# Altium footprint library USBes.PcbLib: 65 footprints (part 2 of 5)
Each footprint in its own frame and in the unit in brackets; x right, y up, seen from the top. Pads: shape width x height; smd on the part's side, far side on the other; paste and mask are expansions set on the pad; w line width, h text height; cw(c..) or ccw(c..) is an arc to the next point about the centre after c.
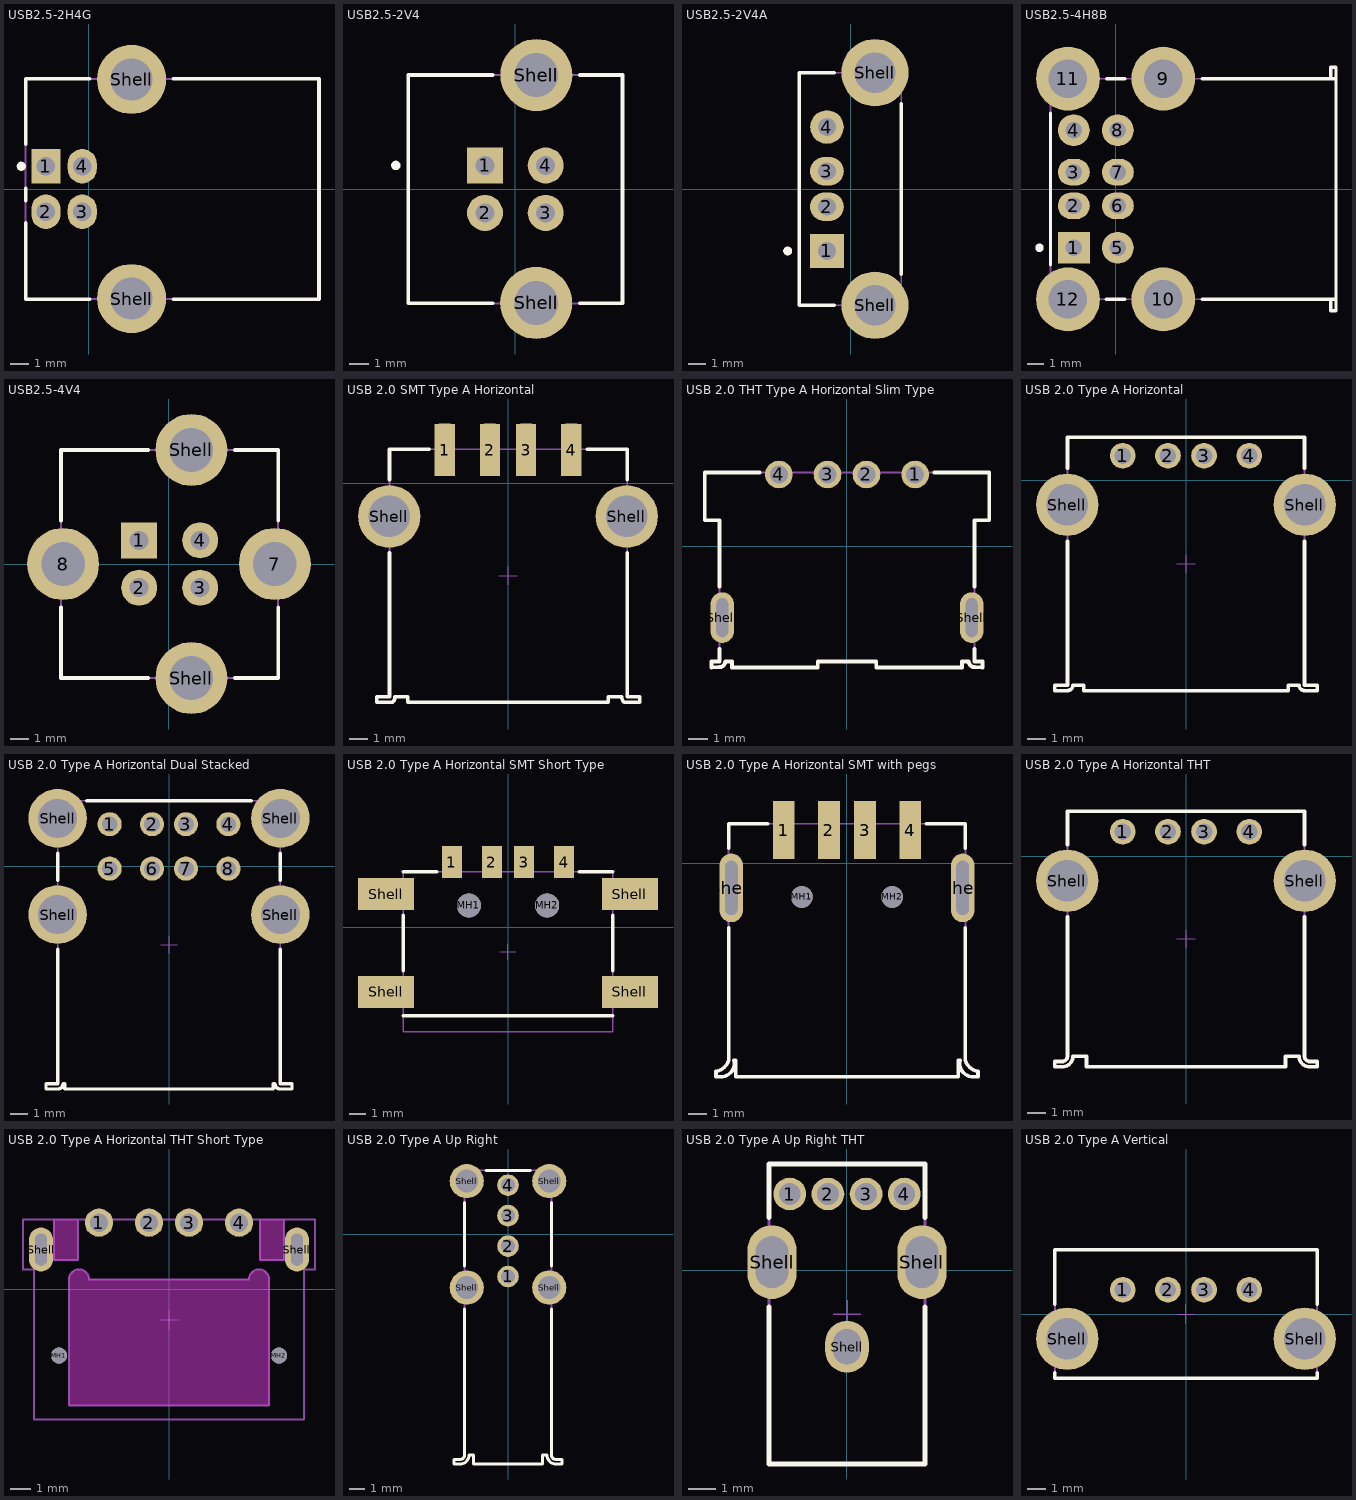
[diagram p1: the footprints below, top view; thin cyan lines are the x and y axes]

## USB2.5-2H4G [mm] "Connector; USB1.1, Type B, Thru-Hole; 4 Position; Right Angle"
height 10.95
pads (6):
  rect 1.6x1.9 hole 1: 1(-2.355,1.25)
  oval 1.6x1.9 hole 1: 2(-2.355,-1.25) 3(-0.355,-1.25) 4(-0.355,1.25)
  round 3.8 hole 2.3: Shell(2.355,-6.02) Shell(2.355,6.02)
Top Overlay:
  circle w0.25: c-3.705,1.25 r0.125
  lines w0.2: -3.465,-1.85 -3.465,-6.05 0.055,-6.05 ; -3.465,-0.65 -3.465,0.05 ; -3.465,2.45 -3.465,6.05 0.055,6.05 ; 4.655,-6.05 12.635,-6.05 ; 4.655,6.05 12.635,6.05 ; 12.655,-6.05 12.655,6.05
Mechanical 13:
  lines w0.1: -3.465,-6.05 12.635,-6.05 12.635,6.05 -3.465,6.05 -3.465,-6.05
3D body "Samtec-DEFAULT.STEP": height 11.05, standoff 0.55, extent 2.582,-5.625 68.532,5.575
3D body "14389.STEP": height 10.95, standoff -3.7, extent -3.855,-7.45 12.645,7.448

## USB2.5-2V4 [mm] "Connector; USB1.1, Type B, Thru-Hole; 4 Position; Vertical ef"
height 16
pads (6):
  rect 1.9x1.9 hole 1: 1(-1.6,1.24)
  round 1.9 hole 1: 2(-1.6,-1.26) 3(1.6,-1.26) 4(1.6,1.24)
  round 3.8 hole 2.3: Shell(1.1,-6.01) Shell(1.11,6.01)
Top Overlay:
  circle w0.25: c-6.3,1.24 r0.125
  lines w0.2: -1.19,-6.03 -5.65,-6.03 -5.65,6.01 -1.19,6.01 ; 3.41,-6.03 5.65,-6.03 5.65,6.01 3.41,6.01
Mechanical 13:
  lines w0.1: -5.65,-6.03 -5.65,6.01 5.65,6.01 5.65,-6.03 -5.65,-6.03
3D body "12039.STEP": height 15.62, standoff -4.02, extent -5.753,-7.585 5.703,7.565

## USB2.5-2V4A [mm] "Connector; USB1.1, Type A, Thru-Hole; 4 Position; Vertical"
height 15
pads (6):
  rect 1.9x1.9 hole 1: 1(-1.355,-3.5)
  oval 1.9x1.6 hole 1: 2(-1.355,-1) 3(-1.355,1)
  round 1.9 hole 1: 4(-1.355,3.5)
  round 3.8 hole 2.3: Shell(1.355,-6.57) Shell(1.355,6.57)
Top Overlay:
  circle w0.25: c-3.575,-3.5 r0.125
  lines w0.2: -0.945,-6.57 -2.925,-6.57 -2.925,6.57 -0.945,6.57 ; 2.835,-4.81 2.835,4.81
Mechanical 13:
  lines w0.1: -2.925,-6.57 -2.925,6.57 2.835,6.57 2.835,-6.57 -2.925,-6.57
3D body "14382.STEP": height 15, standoff -2.99, extent -3.865,-7.992 3.775,7.992

## USB2.5-4H8B [mm] "Connector; USB1.1, Type A, Thru-Hole; 4x4 Position; Right Angle"
height 15.82
pads (12):
  rect 1.9x1.9 hole 1: 1(-2.49,-3.5)
  oval 1.9x1.6 hole 1: 2(-2.49,-1) 3(-2.49,1) 6(0.13,-1) 7(0.13,1)
  round 1.9 hole 1: 4(-2.49,3.5) 5(0.13,-3.5) 8(0.13,3.5)
  round 3.8 hole 2.3: 9(2.84,6.57) 10(2.84,-6.57) 11(-2.84,6.57) 12(-2.84,-6.57)
Top Overlay:
  circle w0.25: c-4.53,-3.5 r0.125
  lines w0.2: -3.88,-4.51 -3.88,4.51 ; -0.56,-6.57 0.54,-6.57 ; -0.54,6.57 0.54,6.57 ; 5.15,-6.57 13.12,-6.57 ; 5.15,6.57 13.12,6.57 ; 12.8,-6.57 12.8,-7.25 13.12,-7.25 13.12,-6.57 ; 12.8,6.57 12.8,7.25 13.12,7.25 13.12,6.57 ; 13.12,-6.57 13.12,6.57
Mechanical 13:
  lines w0.1: -3.88,-7.25 -3.88,7.25 ; -3.88,-6.57 12.8,-6.57 12.8,-7.25 13.12,-7.25 13.12,7.25 12.8,7.25 12.8,6.57 -3.88,6.57
3D body "14378.STEP": height 15.6, standoff -3.8, extent -3.88,-7.849 13.718,7.851

## USB2.5-4V4 [mm] "Connector; USB1.1, Type B, Thru-Hole; 4 Position; Vertical"
height 15.62
pads (8):
  rect 1.9x1.9 hole 1: 1(-1.575,1.25)
  round 1.9 hole 1: 2(-1.575,-1.25) 3(1.645,-1.25) 4(1.645,1.25)
  round 3.8 hole 2.3: 7(5.595,0) 8(-5.595,0) Shell(1.185,-6.02) Shell(1.185,6.02)
Top Overlay:
  lines w0.2: -5.695,-2.3 -5.695,-6.02 -1.115,-6.02 ; -5.695,2.3 -5.695,6.02 -1.115,6.02 ; 3.485,-6.02 5.765,-6.02 5.765,-2.3 ; 3.485,6.02 5.765,6.02 5.765,2.3
Mechanical 13:
  lines w0.1: -5.695,-6.02 -5.695,6.02 5.765,6.02 5.765,-6.02 -5.695,-6.02
3D body "5881.STEP": height 15.8, standoff -4.74, extent -5.615,-7.55 5.885,7.55

## USB 2.0 SMT Type A Horizontal [mm] "USB 2.0 SMT Type A Horizontal"
height 7.12
pads (6):
  rect 1.12x2.88 smd: 1(-3.5,1.835) 2(-1,1.835) 3(1,1.835) 4(3.5,1.835)
  round 3.45 hole 2.3: Shell(-6.57,-1.835) Shell(6.57,-1.835)
Top Overlay:
  lines w0.2: -6.55,-3.855 -6.55,-11.815 -7.25,-11.815 -7.25,-12.115 -6.39,-12.115 ; -6.55,0.185 -6.55,1.885 -4.35,1.885 ; -6.388,-12.117 ccw(c-6.65,-11.815) -6.25,-11.815 -5.55,-11.815 -5.55,-12.115 5.55,-12.115 5.55,-11.815 6.29,-11.815 ccw(c6.69,-11.815) 6.428,-12.117 ; 4.39,1.885 6.59,1.885 6.59,0.185 ; 6.43,-12.115 7.29,-12.115 7.29,-11.815 6.59,-11.815 6.59,-3.855
Mechanical 13:
  lines w0.1: -6.39,-12.115 -7.25,-12.115 -7.25,-11.815 -6.55,-11.815 -6.55,1.885 6.59,1.885 6.59,-11.815 7.29,-11.815 7.29,-12.115 6.43,-12.115 ; -6.388,-12.117 ccw(c-6.65,-11.815) -6.25,-11.815 -5.55,-11.815 -5.55,-12.115 5.55,-12.115 5.55,-11.815 6.29,-11.815 ccw(c6.69,-11.815) 6.428,-12.117 ; -3.8,1.885 -3.8,3.285 -3.2,3.285 -3.2,1.885 ; -1.3,1.885 -1.3,3.285 -0.7,3.285 -0.7,1.885 ; 0.7,1.885 0.7,3.285 1.3,3.285 1.3,1.885 ; 3.2,1.885 3.2,3.285 3.8,3.285 3.8,1.885
Mechanical 15:
  lines w0.05: -0.5,-5.115 0.5,-5.115 ; 0,-5.615 0,-4.615
3D body "62900416021.stp": height 7.81, standoff -3.89, extent -7.808,-12.115 7.81,3.29

## USB 2.0 THT Type A Horizontal Slim Type [mm] "USB 2.0 THT Type A Horizontal Slim Type"
height 6.82
pads (6):
  round 1.42 hole 0.92: 1(3.5,3.675) 2(1,3.675) 3(-1,3.675) 4(-3.5,3.675)
  oval 1.2x2.6 hole 0.6 slot 2 at 90 deg: Shell(-6.4,-3.675) Shell(6.4,-3.675)
Top Overlay:
  lines w0.2: -6.55,-5.275 -6.55,-5.915 -6.95,-5.915 -6.95,-6.225 -6.56,-6.215 ccw(c-6.55,-5.915) -6.25,-5.915 -5.9,-5.915 -5.9,-6.225 -1.5,-6.225 -1.5,-5.925 1.5,-5.925 1.5,-6.225 5.9,-6.225 5.9,-5.915 6.25,-5.915 ccw(c6.55,-5.915) 6.56,-6.215 6.95,-6.225 6.95,-5.915 6.55,-5.915 6.55,-5.275 ; -6.55,-2.075 -6.55,1.325 -7.3,1.325 -7.3,3.775 -4.5,3.775 ; 4.5,3.775 7.3,3.775 7.3,1.325 6.55,1.325 6.55,-2.075
Mechanical 13:
  lines w0.1: -7.3,1.325 -6.55,1.325 -6.55,-5.915 -6.95,-5.915 -6.95,-6.225 -6.56,-6.215 ccw(c-6.55,-5.915) -6.25,-5.915 -5.9,-5.915 -5.9,-6.225 -1.5,-6.225 -1.5,-5.925 1.5,-5.925 1.5,-6.225 5.9,-6.225 5.9,-5.915 6.25,-5.915 ccw(c6.55,-5.915) 6.56,-6.215 6.95,-6.225 6.95,-5.915 6.55,-5.915 6.55,1.325 7.3,1.325 7.3,3.775 -7.3,3.775 -7.3,1.325
3D body "614104150121.stp": height 7.24, standoff -1.58, extent -7.3,-6.225 7.3,3.775

## USB 2.0 Type A Horizontal [mm] "USB 2.0 Type A Horizontal"
height 6.9
pads (6):
  round 1.42 hole 0.92: 1(-3.5,1.355) 2(-1,1.355) 3(1,1.355) 4(3.5,1.355)
  round 3.45 hole 2.3: Shell(-6.57,-1.355) Shell(6.57,-1.355)
Top Overlay:
  lines w0.2: -6.55,-3.375 -6.55,-11.335 -7.25,-11.335 -7.25,-11.635 -6.56,-11.635 ccw(c-6.55,-11.335) -6.25,-11.335 -5.65,-11.335 -5.65,-11.635 5.65,-11.635 5.65,-11.335 6.25,-11.335 ccw(c6.55,-11.335) 6.56,-11.635 7.25,-11.635 7.25,-11.335 6.55,-11.335 6.55,-3.375 ; -6.55,0.665 -6.55,2.365 6.55,2.365 6.55,0.665
Mechanical 2:
  lines w0.1: -5.65,-11.635 5.65,-11.635
Mechanical 13:
  lines w0.1: -7.25,-11.635 -6.56,-11.635 ccw(c-6.55,-11.335) -6.25,-11.335 -5.65,-11.335 -5.65,-11.635 5.65,-11.635 5.65,-11.335 6.25,-11.335 ccw(c6.55,-11.335) 6.56,-11.635 7.25,-11.635 7.25,-11.335 6.55,-11.335 6.55,2.365 -6.55,2.365 -6.55,-11.335 -7.25,-11.335 -7.25,-11.635
Mechanical 15:
  lines w0.05: -0.5,-4.635 0.5,-4.635 ; 0,-5.135 0,-4.135
3D body "61400416021.stp": height 7.63, standoff -4.06, extent -7.998,-11.635 7.998,2.365

## USB 2.0 Type A Horizontal Dual Stacked [mm] "USB 2.0 Type A Horizontal Dual Stacked"
height 15.34
pads (12):
  round 1.42 hole 0.92: 1(-3.5,2.49) 2(-1,2.49) 3(1,2.49) 4(3.5,2.49) 5(-3.5,-0.13) 6(-1,-0.13) 7(1,-0.13) 8(3.5,-0.13)
  round 3.45 hole 2.3: Shell(-6.57,-2.84) Shell(-6.57,2.84) Shell(6.57,-2.84) Shell(6.57,2.84)
Top Overlay:
  lines w0.2: -6.55,-4.87 -6.55,-12.82 -7.25,-12.82 -7.25,-13.12 -6.56,-13.12 ccw(c-6.55,-12.82) -6.25,-12.82 -6.15,-12.82 -6.15,-13.12 6.15,-13.12 6.15,-12.82 6.25,-12.82 ccw(c6.55,-12.82) 6.56,-13.12 7.25,-13.12 7.25,-12.82 6.55,-12.82 6.55,-4.87 ; -6.55,-0.81 -6.55,0.78 ; -4.85,3.88 4.85,3.88 ; 6.55,-0.81 6.55,0.78
Mechanical 13:
  lines w0.1: -7.25,-13.12 -7.25,-12.82 -6.55,-12.82 -6.55,3.88 6.55,3.88 6.55,-12.82 7.25,-12.82 7.25,-13.12 6.56,-13.12 cw(c6.55,-12.82) 6.25,-12.82 6.15,-12.82 6.15,-13.12 -6.15,-13.12 -6.15,-12.82 -6.25,-12.82 cw(c-6.55,-12.82) -6.56,-13.12 -7.25,-13.12
Mechanical 15:
  lines w0.05: -0.5,-4.62 0.5,-4.62 ; 0,-5.12 0,-4.12
3D body "61400826021.stp": height 15.93, standoff -3.91, extent -7.913,-13.12 7.913,4.03

## USB 2.0 Type A Horizontal SMT Short Type [mm] "USB 2.0 Type A Horizontal SMT Short Type"
height 6.3
pads (10):
  rect 1.25x2 smd: 1(-3.5,4.05) 2(-1,4.05) 3(1,4.05) 4(3.5,4.05)
  round 1.5 hole 1.5 unplated: MH1(-2.45,1.35) MH2(2.45,1.35)
  rect 3.5x2 smd: Shell(-7.625,-4.05) Shell(-7.625,2.05) Shell(7.625,-4.05) Shell(7.625,2.05)
Top Overlay:
  lines w0.2: -6.55,-5.55 6.55,-5.55 ; -6.55,-2.75 -6.55,0.75 ; -6.55,3.45 -4.45,3.45 ; 4.45,3.45 6.55,3.45 ; 6.55,-2.75 6.55,0.75
Mechanical 13:
  lines w0.1: -6.55,-4.8 -8.25,-4.8 -8.25,-3.3 -6.55,-3.3 ; -6.55,1.3 -8.25,1.3 -8.25,2.8 -6.55,2.8 ; -3.775,3.45 -3.775,4.55 -3.225,4.55 -3.225,3.45 ; -1.275,3.45 -1.275,4.55 -0.725,4.55 -0.725,3.45 ; 0.725,3.45 0.725,4.55 1.275,4.55 1.275,3.45 ; 3.225,3.45 3.225,4.55 3.775,4.55 3.775,3.45 ; 6.55,-4.8 8.25,-4.8 8.25,-3.3 6.55,-3.3 ; 6.55,1.3 8.25,1.3 8.25,2.8 6.55,2.8 ; -6.55,-6.55 6.55,-6.55 6.55,3.45 -6.55,3.45 -6.55,-6.55
Mechanical 15:
  lines w0.05: -0.5,-1.55 0.5,-1.55 ; 0,-2.05 0,-1.05
3D body "629104190121.stp": height 6.35, standoff -0.12, extent -8.25,-6.55 8.25,4.559

## USB 2.0 Type A Horizontal SMT with pegs [mm] "USB 2.0 Type A Horizontal SMT with pegs"
height 7
pads (8):
  rect 1.2x3.2 smd: 1(-3.5,1.85) 2(-1,1.85) 3(1,1.85) 4(3.5,1.85)
  round 1.2 hole 1.2 unplated: MH1(-2.5,-1.85) MH2(2.5,-1.85)
  oval 1.3x3.8 hole 0.7 slot 3 at 90 deg: Shell(-6.4,-1.35) Shell(6.4,-1.35)
Top Overlay:
  lines w0.2: -7.25,-11.508 -7.25,-11.8 -6.87,-11.799 ccw(c-6.983,-11.057) -6.25,-10.9 -6.15,-10.9 -6.15,-11.8 6.15,-11.8 6.15,-10.9 6.25,-10.9 ccw(c6.983,-11.057) 6.87,-11.799 7.25,-11.8 7.25,-11.508 ; -7.249,-11.508 ccw(c-7.39,-10.64) -6.55,-10.9 -6.55,-3.55 ; -6.55,0.85 -6.55,2.2 -4.4,2.2 ; 4.4,2.2 6.55,2.2 6.55,0.85 ; 6.55,-3.55 6.55,-10.9 ccw(c7.39,-10.64) 7.249,-11.508
Mechanical 2:
  lines w0.1: -6.15,-11.8 6.15,-11.8
Mechanical 13:
  lines w0.1: -7.25,-11.508 -7.25,-11.8 -6.87,-11.799 ccw(c-6.983,-11.057) -6.25,-10.9 -6.15,-10.9 -6.15,-11.8 6.15,-11.8 6.15,-10.9 6.25,-10.9 ccw(c6.983,-11.057) 6.87,-11.799 7.25,-11.8 7.25,-11.508 ; -7.249,-11.508 ccw(c-7.39,-10.64) -6.55,-10.9 -6.55,2.2 6.55,2.2 6.55,-10.9 ccw(c7.39,-10.64) 7.249,-11.508 ; -3.8,2.2 -3.8,3.4 -3.2,3.4 -3.2,2.2 ; -1.3,2.2 -1.3,3.4 -0.7,3.4 -0.7,2.2 ; 0.7,2.2 0.7,3.4 1.3,3.4 1.3,2.2 ; 3.2,2.2 3.2,3.4 3.8,3.4 3.8,2.2
3D body "629104151021.stp": height 7.34, standoff -2.16, extent -7.25,-11.8 7.25,3.4

## USB 2.0 Type A Horizontal THT [mm] "USB 2.0 Type A Horizontal THT"
height 6.9
pads (6):
  round 1.42 hole 0.92: 1(-3.5,1.355) 2(-1,1.355) 3(1,1.355) 4(3.5,1.355)
  round 3.45 hole 2.3: Shell(-6.57,-1.355) Shell(6.57,-1.355)
Top Overlay:
  lines w0.2: -6.55,-3.355 -6.55,-11.055 cw(c-6.85,-11.055) -6.85,-11.355 -7.25,-11.355 -7.25,-11.655 -6.85,-11.655 ccw(c-6.85,-11.055) -6.25,-11.055 -5.5,-11.055 -5.5,-11.655 5.5,-11.655 5.5,-11.055 6.25,-11.055 ccw(c6.85,-11.055) 6.85,-11.655 7.25,-11.655 7.25,-11.355 6.85,-11.355 cw(c6.85,-11.055) 6.55,-11.055 6.55,-3.355 ; -6.55,0.645 -6.55,2.495 6.55,2.495 6.55,0.645
Mechanical 13:
  lines w0.1: -7.25,-11.655 -6.85,-11.655 ccw(c-6.85,-11.055) -6.25,-11.055 -5.5,-11.055 -5.5,-11.655 5.5,-11.655 5.5,-11.055 6.25,-11.055 ccw(c6.85,-11.055) 6.85,-11.655 7.25,-11.655 7.25,-11.355 6.85,-11.355 cw(c6.85,-11.055) 6.55,-11.055 6.55,2.495 -6.55,2.495 -6.55,-11.055 cw(c-6.85,-11.055) -6.85,-11.355 -7.25,-11.355 -7.25,-11.655
Mechanical 15:
  lines w0.05: -0.5,-4.58 0.5,-4.58 ; 0,-5.08 0,-4.08
3D body "614004190021.stp": height 7.73, standoff -3.67, extent -7.85,-11.655 7.85,2.495

## USB 2.0 Type A Horizontal THT Short Type [mm] "USB 2.0 Type A Horizontal THT Short Type"
height 5.72
pads (8):
  round 1.42 hole 0.92: 1(-3.5,3.325) 2(-1,3.325) 3(1,3.325) 4(3.5,3.325)
  round 0.8 hole 0.8 unplated: MH1(-5.5,-3.325) MH2(5.5,-3.325)
  oval 1.2x2.2 hole 0.6 slot 1.6 at 90 deg: Shell(-6.4,1.975) Shell(6.4,1.975)
Keep-Out Layer:
  board cut-out: -4.55,3.475 -5.75,3.475 -5.75,1.455 -4.55,1.455
  board cut-out: -5,-5.825 5,-5.825 5,0.485 5,0.584 4.924,0.768 4.783,0.909 4.599,0.985 4.401,0.985 4.217,0.909 4.076,0.768 4,0.584 4,0.485 -4,0.485 -4,0.584 -4.076,0.768 -4.217,0.909 -4.401,0.985 -4.599,0.985 -4.783,0.909 -4.924,0.768 -5,0.584 -5,0.485
  board cut-out: 4.55,3.475 5.75,3.475 5.75,1.455 4.55,1.455
Mechanical 2:
  lines w0.1: -5.75,1.455 -4.55,1.455 -4.55,3.475 -5.75,3.475 -5.75,1.455 ; -5,-5.825 -5,0.485 cw(c-4.5,0.485) -4,0.485 4,0.485 cw(c4.5,0.485) 5,0.485 5,-5.825 -5,-5.825 ; 4.55,1.455 5.75,1.455 5.75,3.475 4.55,3.475 4.55,1.455
Mechanical 13:
  lines w0.1: -7.3,0.975 -7.3,3.475 7.3,3.475 7.3,0.975 6.75,0.975 6.75,-6.525 -6.75,-6.525 -6.75,0.975 -7.3,0.975
Mechanical 15:
  lines w0.05: -0.5,-1.525 0.5,-1.525 ; 0,-2.025 0,-1.025
3D body "614104190121.stp": height 5.8, standoff -1.91, extent -7.3,-6.525 7.3,3.475

## USB 2.0 Type A Up Right [mm] "USB 2.0 Type A Up Right"
height 14.5
pads (8):
  round 1.42 hole 0.92: 1(0,-2.77) 2(0,-0.77) 3(0,1.23) 4(0,3.23)
  round 2.25 hole 1.5: Shell(-2.71,-3.5) Shell(-2.71,3.5) Shell(2.71,-3.5) Shell(2.71,3.5)
Top Overlay:
  lines w0.2: -2.86,-4.91 -2.86,-14.51 cw(c-3.15,-14.51) -3.15,-14.8 -3.55,-14.8 -3.55,-15.1 -3.15,-15.1 ccw(c-3.15,-14.51) -2.56,-14.51 -2.27,-14.51 -2.27,-15.1 2.27,-15.1 2.27,-14.51 2.56,-14.51 ccw(c3.15,-14.51) 3.15,-15.1 3.55,-15.1 3.55,-14.8 3.15,-14.8 cw(c3.15,-14.51) 2.86,-14.51 2.86,-4.91 ; -2.86,-2.09 -2.86,2.09 ; -1.46,4.2 1.49,4.2 ; 2.86,-2.09 2.86,2.09
Mechanical 13:
  lines w0.1: -3.55,-15.1 -3.15,-15.1 ccw(c-3.15,-14.51) -2.56,-14.51 -2.27,-14.51 -2.27,-15.1 2.27,-15.1 2.27,-14.51 2.56,-14.51 ccw(c3.15,-14.51) 3.15,-15.1 3.55,-15.1 3.55,-14.8 3.15,-14.8 cw(c3.15,-14.51) 2.86,-14.51 2.86,4.2 -2.86,4.2 -2.86,-14.51 cw(c-3.15,-14.51) -3.15,-14.8 -3.55,-14.8 -3.55,-15.1
3D body "614004134726.stp": height 14.49, standoff -3.82, extent -3.55,-15.1 3.55,4.2

## USB 2.0 Type A Up Right THT [mm] "USB 2.0 Type A Up Right THT"
height 14.2
pads (7):
  round 1.2 hole 0.8: 1(-2.1,2.8) 2(-0.7,2.8) 3(0.7,2.8) 4(2.1,2.8)
  oval 1.8x2.7 hole 1.2 slot 1.9 at 90 deg: Shell(-2.75,0.3) Shell(2.75,0.3)
  oval 1.6x1.9 hole 1 slot 1.3 at 90 deg: Shell(0,-2.8)
Top Overlay:
  lines w0.2: -2.86,-1.35 -2.86,-7.1 2.86,-7.1 2.86,-1.35 ; -2.86,1.95 -2.86,3.9 2.86,3.9 2.86,1.95
Mechanical 13:
  lines w0.1: -2.86,-7.1 -2.86,3.9 2.86,3.9 2.86,-7.1 -2.86,-7.1
Mechanical 15:
  lines w0.05: -0.5,-1.6 0.5,-1.6 ; 0,-2.1 0,-1.1
3D body "614004184726.stp": height 14.27, standoff -2.77, extent -3.559,-7.1 3.559,3.9

## USB 2.0 Type A Vertical [mm] "USB 2.0 Type A Vertical"
height 15
pads (6):
  round 1.42 hole 0.92: 1(-3.5,1.355) 2(-1,1.355) 3(1,1.355) 4(3.5,1.355)
  round 3.45 hole 2.3: Shell(-6.57,-1.355) Shell(6.57,-1.355)
Top Overlay:
  lines w0.2: -7.25,-3.245 -7.25,-3.545 7.25,-3.545 7.25,-3.245 ; -7.25,0.555 -7.25,3.575 7.25,3.575 7.25,0.555
Mechanical 13:
  lines w0.1: -7.25,-3.545 7.25,-3.545 7.25,3.575 -7.25,3.575 -7.25,-3.545
Mechanical 15:
  lines w0.05: -0.5,0.015 0.5,0.015 ; 0,-0.485 0,0.515
3D body "614004135023.stp": height 15.02, standoff -4.28, extent -8,-3.545 7.999,3.575